# Altium footprint library THU VIEN PCB.PCBLib: 911 footprints (part 27 of 57)
Each footprint in its own frame and in the unit in brackets; x right, y up, seen from the top. Pads: shape width x height; smd on the part's side, far side on the other; paste and mask are expansions set on the pad; w line width, h text height; cw(c..) or ccw(c..) is an arc to the next point about the centre after c.
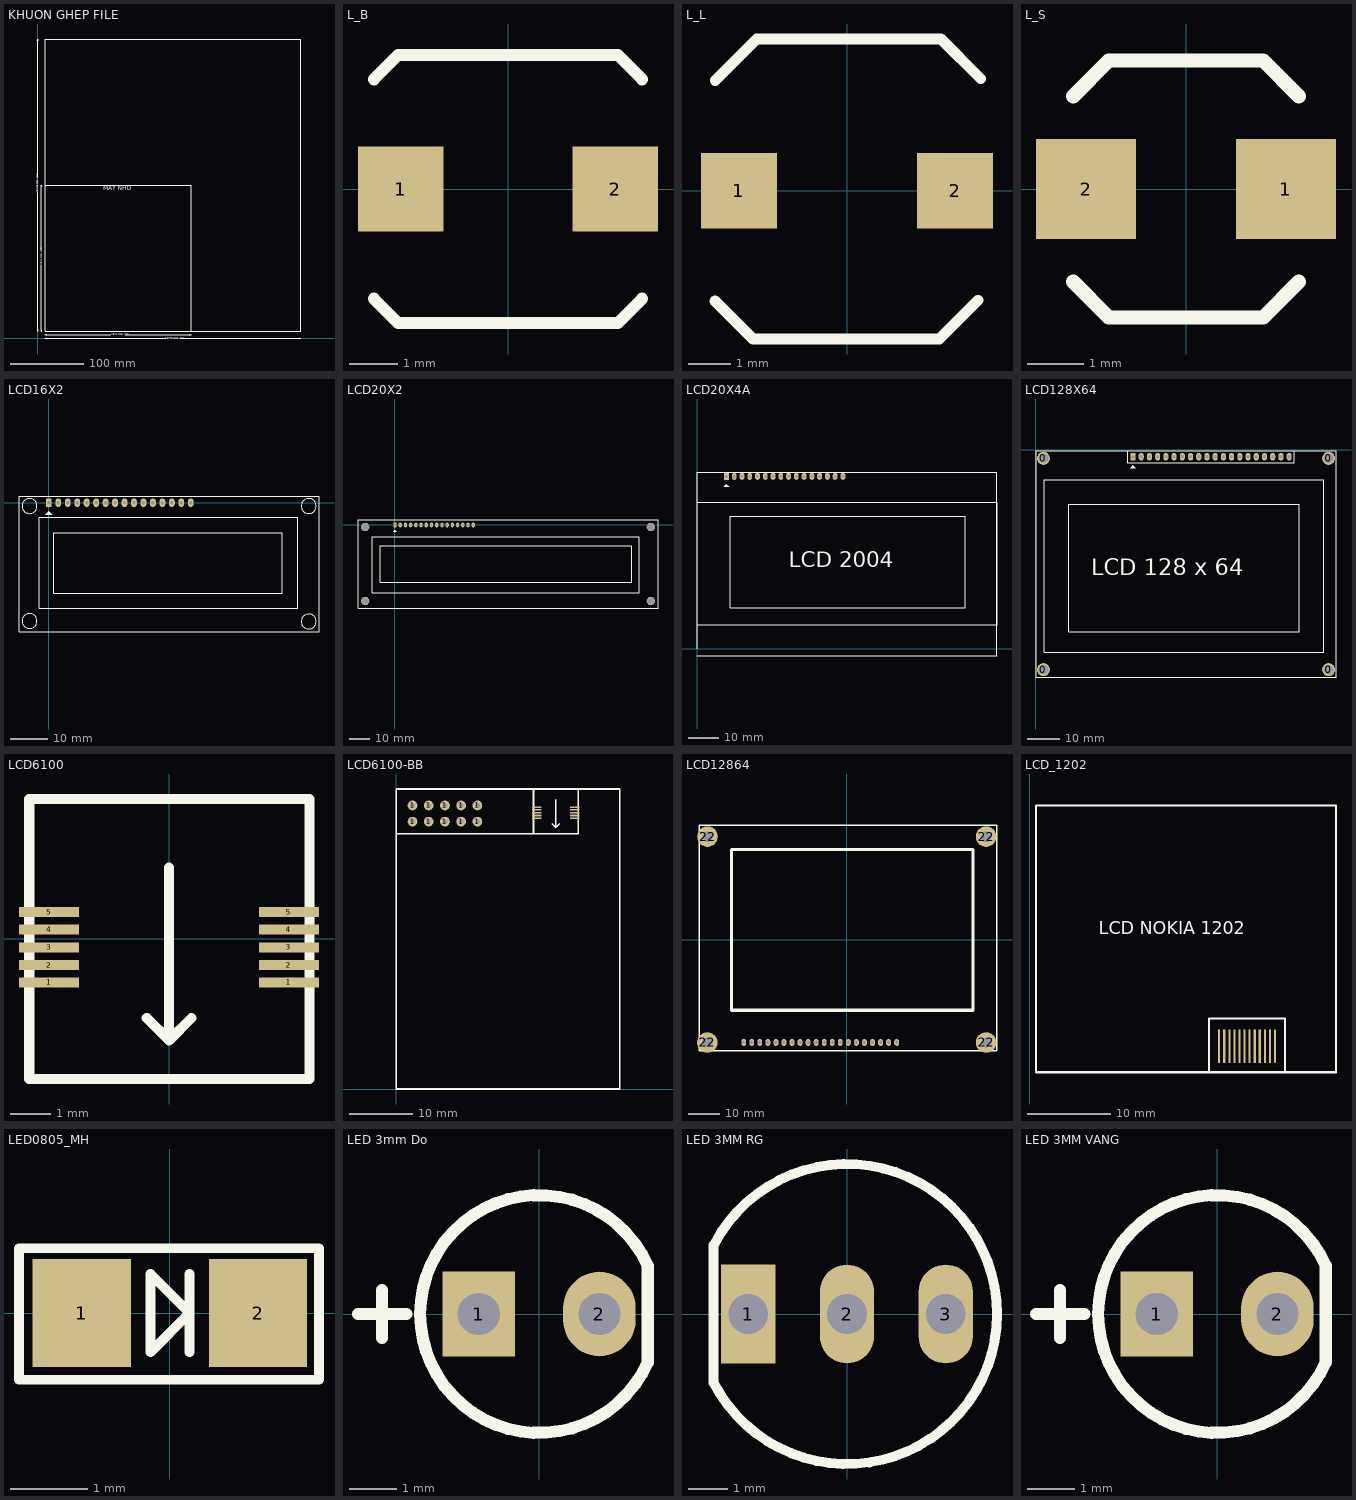
[diagram p26: the footprints below, top view; thin cyan lines are the x and y axes]

## KHUON GHEP FILE [mil]
Top Overlay:
  lines w10: -13.7,460 6.3,400 ; -13.7,16088.03 6.3,16148.03 ; -3.7,400 16.3,400 ; -3.7,16148.03 16.3,16148.03 ; 6.3,7858.15 6.3,400 ; 6.3,8689.89 6.3,16148.03 ; 26.3,460 6.3,400 ; 26.3,16088.03 6.3,16148.03 ; 183.15,460 203.15,400 ; 183.15,8214.02 203.15,8274.02 ; 193.15,400 213.15,400 ; 193.15,8274.02 213.15,8274.02 ; 203.15,3946.13 203.15,400 ; 203.15,4727.89 203.15,8274.02 ; 223.15,460 203.15,400 ; 223.15,8214.02 203.15,8274.02 ; 400,-3.7 400,16.3 ; 400,193.15 400,213.15 ; 460,-13.7 400,6.3 ; 460,26.3 400,6.3 ; 460,183.15 400,203.15 ; 460,223.15 400,203.15 ; 3946.13,203.15 400,203.15 ; 4727.89,203.15 8274.02,203.15 ; 6868.89,6.3 400,6.3 ; 7710.63,6.3 14179.53,6.3 ; 8214.02,183.15 8274.02,203.15 ; 8214.02,223.15 8274.02,203.15 ; 8274.02,193.15 8274.02,213.15 ; 14119.53,-13.7 14179.53,6.3 ; 14119.53,26.3 14179.53,6.3 ; 14179.53,-3.7 14179.53,16.3 ; 400,8274.02 400,16148.03 14179.53,16148.03 14179.53,400 8274.02,400 ; 400,8274.02 400,400 8274.02,400 ; 400,8274.02 8274.02,8274.02 8274.02,400
  text "MAY NHO" at 3549.61,7919.69 h393.7
  text "15748.031 (mil)" at 42.29,7868.15 h60
  text "13779.528 (mil)" at 6878.89,-29.69 h60
  text "7874.016 (mil)" at 239.14,3956.13 h60
  text "7874.016 (mil)" at 3956.13,167.16 h60

## L_B [mil]
pads (2):
  rect 70x70 smd: 1(-88,0) 2(88,0)
Top Overlay:
  lines w10: -110,-90 -90,-110 90,-110 110,-90 ; -110,90 -90,110 90,110 110,90

## L_L [mil]
pads (2):
  rect 70x70 smd: 1(-100,0) 2(100,0)
Top Overlay:
  lines w10: -122.12,-102.12 -87,-137.25 85.5,-137.25 121.38,-101.38 ; -122,102 -83.5,140.5 87,140.5 123.75,103.75

## L_S [mil]
pads (2):
  rect 70x70 smd: 1(70,0) 2(-70,0)
Top Overlay:
  lines w10: -79,-65 -54,-90 54,-90 79,-65 ; -79,65 -54,90 54,90 79,65

## LCD16X2 [mil] "LCD dipslay 16x2, 16 pin"
height 400
pads (16):
  rect 62x90 hole 36: 1(0,0)
  oval 62x90 hole 36: 2(100,0) 3(200,0) 4(300,0) 5(400,0) 6(500,0) 7(600,0) 8(700,0) 9(800,0) 10(900,0) 11(1000,0) 12(1100,0) 13(1200,0) 14(1300,0) 15(1400,0) 16(1500,0)
Top Overlay:
  circle w7: c2745.94,-1255 r79.06
  circle w7: c2745.94,-35 r79.06
  circle w7: c-204.06,-35 r79.06
  circle w7: c-204.06,-1250 r79.06
  region: 0,-90 -35,-125 35,-125
  lines w7: -315,-1365 -315,70 2855,70 2855,-1365 -315,-1365 ; -100,-1115 -100,-155 2630,-155 2630,-1115 -100,-1115 ; 50,-955 50,-315 2465,-315 2465,-955 50,-955
3D body "LCD module 16 X 2 backlight.STEP": height 914, standoff 394, extent -314.64,-1360 2854.65,77.01

## LCD20X2 [mil] "LCD dipslay 20x2, 16 pin"
height 400
pads (20):
  rect 62x90 hole 36: 1(0,0)
  oval 62x90 hole 36: 2(100,0) 3(200,0) 4(300,0) 5(400,0) 6(500,0) 7(600,0) 8(700,0) 9(800,0) 10(900,0) 11(1000,0) 12(1100,0) 13(1200,0) 14(1300,0) 15(1400,0) 16(1500,0)
  round 157.48 hole 137.8: "Hole 0"(-570.87,-1456.69) "Hole 0"(-570.87,-39.37) "Hole 0"(4901.57,-1456.69) "Hole 0"(4901.57,-39.37)
Top Overlay:
  region: 0,-90 -35,-125 35,-125
  lines w7: -708.66,-1594.49 -708.66,100 5039.37,100 5039.37,-1594.49 -708.66,-1594.49 ; -436,-1300 -436,-225 4682,-225 4682,-1300 -436,-1300 ; -286,-1100 -286,-400 4532,-400 4532,-1100 -286,-1100
3D body "SW3dPS-Display20x2.STEP": height 198, standoff -180, extent -100,-1437 4470,33

## LCD20X4A [mil] "LCD dipslay 20x4, 16 pin"
height 400
pads (16):
  rect 62x90 hole 39: 1(374.8,2219.69)
  oval 62x90 hole 39: 2(474.8,2219.69) 3(574.8,2219.69) 4(674.8,2219.69) 5(774.8,2219.69) 6(874.8,2219.69) 7(974.8,2219.69) 8(1074.8,2219.69) 9(1174.8,2219.69) 10(1274.8,2219.69) 11(1374.8,2219.69) 12(1474.8,2219.69) 13(1574.8,2219.69) 14(1674.8,2219.69) 15(1774.8,2219.69) 16(1874.8,2219.69)
Top Overlay:
  region: 374.8,2119.69 339.8,2084.69 409.8,2084.69
  lines w7: -5,-90 3860,-90 ; -0.2,-0.31 -0.2,2269.69 3859.8,2269.69 3859.8,-90 ; 425,524.69 3450,524.69 3450,1707.69 425,1707.69 ; 425,525 425,1705 ; 0,305 3860,305 3860,1882.69 0,1882.69 0,305
  text "LCD 2004" at 1175,1045 h200
3D body "User Library-LCD20_4.STEP": height 567.32, standoff 24.02, extent 0,-92.21 3858.27,2270

## LCD128X64 [mil] "LCD Graphic 128x64, 20 pin"
height 400
pads (24):
  round 157.48 hole 118.11: 0(95,-2675) 0(95,-105) 0(3565,-2675) 0(3565,-105)
  rect 62x90 hole 39: 1(1185,-85)
  oval 62x90 hole 39: 2(1285,-85) 3(1385,-85) 4(1485,-85) 5(1585,-85) 6(1685,-85) 7(1785,-85) 8(1885,-85) 9(1985,-85) 10(2085,-85) 11(2185,-85) 12(2285,-85) 13(2385,-85) 14(2485,-85) 15(2585,-85) 16(2685,-85) 17(2785,-85) 18(2885,-85) 19(2985,-85) 20(3085,-85)
Top Overlay:
  region: 1185,-190 1150,-225 1220,-225
  lines w7: 1120,-156 1120,-15 3150,-15 3150,-156 1120,-156
  lines w10: 5,-2765 5,-15 15,-15 3145,-15 3655,-15 3655,-2765 5,-2765 ; 105,-2465 105,-365 3505,-365 3505,-2465 105,-2465 ; 405,-2215 405,-665 3205,-665 3205,-2215 405,-2215
  text "LCD 128 x 64" at 680,-1525 h200
3D body "LCD 128x64.step": height 234.65, standoff -157.48, extent 2.32,-2772.95 3667.68,-17.04

## LCD6100 [mm]
pads (10):
  rect 1.5x0.25 smd: 1(-3,-1.091) 1(2.994,-1.091) 2(-3,-0.66) 2(2.994,-0.66) 3(-3,-0.215) 3(2.994,-0.215) 4(-3,0.229) 4(2.994,0.229) 5(-3,0.661) 5(2.994,0.661)
Top Overlay:
  lines w0.254: -0.559,-1.981 0,-2.54 ; 0,1.778 0,-2.54 ; 0.559,-1.981 0,-2.54 ; -3.493,-3.507 3.507,-3.507 3.507,3.493 -3.493,3.493 -3.493,-3.507

## LCD6100-BB [mil]
pads (20):
  round 60 hole 30: 1(100,1649) 1(100,1749) 1(200,1649) 1(200,1749) 1(300,1649) 1(300,1749) 1(400,1649) 1(400,1749) 1(500,1649) 1(500,1749)
  rect 59.06x9.84 smd: 1(865.83,1669.92) 1(1101.83,1669.92) 2(865.83,1686.92) 2(1101.83,1686.92) 3(865.83,1704.42) 3(1101.83,1704.42) 4(865.83,1721.92) 4(1101.83,1721.92) 5(865.83,1738.92) 5(1101.83,1738.92)
Top Overlay:
  lines w10: 0,0 1377.95,0 1377.95,1849.39 ; 0,1 0,1850.39 1377.95,1850.39 ; 0,1574.8 1122.05,1574.8 ; 961.96,1634.89 983.96,1612.89 ; 983.96,1782.89 983.96,1612.89 ; 1005.96,1634.89 983.96,1612.89 ; 1122.05,1574.8 1122.05,1850.39 846.46,1850.39 846.46,1574.8 1122.05,1574.8

## LCD12864 [mm] "LCD12864"
pads (25):
  oval 1.524x2.159 hole 1.1: 1(15.76,-32.5) 1(15.76,-32.5) 2(13.22,-32.5) 3(10.68,-32.5) 4(8.14,-32.5) 5(5.6,-32.5) 6(3.06,-32.5) 7(0.52,-32.5) 8(-2.02,-32.5) 9(-4.56,-32.5) 10(-7.1,-32.5) 11(-9.64,-32.5) 12(-12.18,-32.5) 13(-14.72,-32.5) 14(-17.26,-32.5) 15(-19.8,-32.5) 16(-22.34,-32.5) 17(-24.88,-32.5) 18(-27.42,-32.5) 19(-29.96,-32.5) 20(-32.5,-32.5)
  round 6.5 hole 3.3: 22(-44,-32.5) 22(-43.93,32.5) 22(44,-32.5) 22(44,32.5)
Top Overlay:
  lines w0.45: -46.54,-35.04 47.44,-35.04 47.44,36.08 -46.54,36.08 -46.54,-35.04
  lines w1: -36.38,-22.34 -36.38,28.46 39.82,28.46 39.82,-22.34 -36.38,-22.34

## LCD_1202 [mil]
pads (12):
  oval 10x157.48 smd: 1(1159,404)
  rect 10x157.48 smd: 2(1135,404) 3(1111,404) 4(1087,404) 5(1063,404) 6(1039,404) 7(1015,404) 8(991,404) 9(967,404) 10(943,404) 11(919,404) 12(895,404)
Top Overlay:
  lines w10: 843,282 847,282 847,535 1206,535 1206,280 ; 29.68,281.26 1447,281.26 1447,1541.1 29.68,1541.1 29.68,281.26
  text "LCD NOKIA 1202" at 325.92,933.56 h60

## LED0805_MH [mil] "led dán 0805"
pads (2):
  rect 50x55 smd: 1(-45,0) 2(45,0)
Top Overlay:
  lines w5: 10,-20 10,20 ; -77,-34 76,-34 76,33 -77,33 -77,-34 ; -10,-20 -10,20 10,0 -10,-20
3D body "Led SMD 0805.step": height 43.31, standoff 0, extent -39.76,-24.6 39.77,24.61

## LED 3mm Do [mil] "Footprintf LED phi 3"
pads (2):
  rect 60x70 hole 35: 1(-50,0)
  oval 60x70 hole 35: 2(50,0)
Top Overlay:
  lines w10: -150,0 -110,0 ; -130,-20 -130,20 ; 90,-40 cw(c0,0) 90,40 90,-40
3D body "Led 3mm Do.STEP.step": height 205.32, standoff -117.51, extent -77.16,-78.45 60,78.47

## LED 3MM RG [mil]
pads (3):
  rect 55x100 hole 40: 1(-100,0)
  oval 55x100 hole 40: 2(0,0) 3(100,0)
Top Overlay:
  lines w10: -135,-70 -135,70 ; -134.81,-69.9 ccw(c0,0) -134.59,70.33
3D body "User Library-LED RG.step": height 311.26, standoff -217.48, extent -88.58,-78.74 88.58,78.74

## LED 3MM VANG [mil]
pads (2):
  rect 60x70 hole 35: 1(-50,0)
  oval 60x70 hole 35: 2(50,0)
Top Overlay:
  lines w10: -150,0 -140,0 -110,0 ; -130,-20 -130,20 ; 90,-40 cw(c0,0) 90,40 90,-40
3D body "Led 3mm Vang.step": height 205.33, standoff -117.51, extent -77.16,-78.45 60,78.47